# Altium footprint library 排针-排母-1.27.PcbLib: 152 footprints (part 2 of 10)
Each footprint in its own frame and in the unit in brackets; x right, y up, seen from the top. Pads: shape width x height; smd on the part's side, far side on the other; paste and mask are expansions set on the pad; w line width, h text height; cw(c..) or ccw(c..) is an arc to the next point about the centre after c.
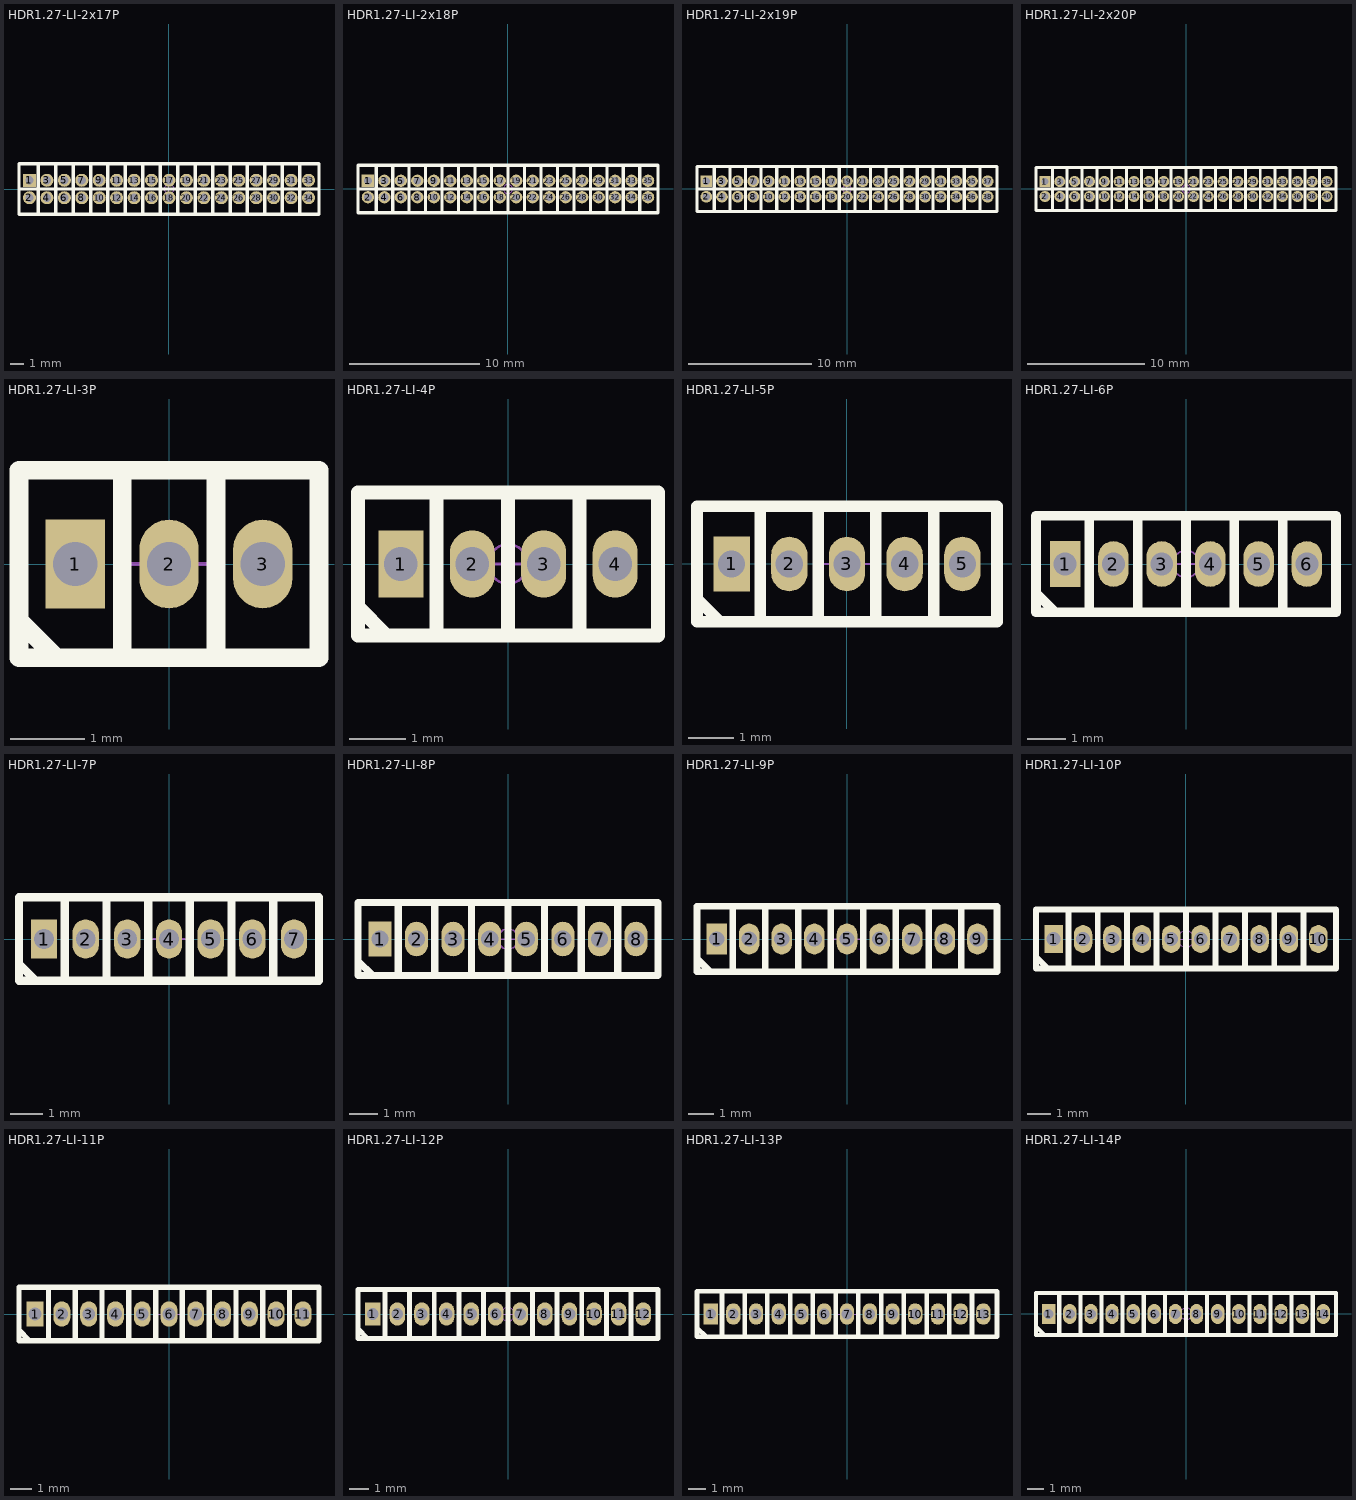
[diagram p1: the footprints below, top view; thin cyan lines are the x and y axes]

## HDR1.27-LI-2x17P [mm] "双排直插，脚距：1.27mm"
pads (34):
  rect 0.95x0.95 hole 0.6: 1(-10.16,0.635)
  round 0.95 hole 0.6: 2(-10.16,-0.635) 3(-8.89,0.635) 4(-8.89,-0.635) 5(-7.62,0.635) 6(-7.62,-0.635) 7(-6.35,0.635) 8(-6.35,-0.635) 9(-5.08,0.635) 10(-5.08,-0.635) 11(-3.81,0.635) 12(-3.81,-0.635) 13(-2.54,0.635) 14(-2.54,-0.635) 15(-1.27,0.635) 16(-1.27,-0.635) 17(0,0.635) 18(0,-0.635) 19(1.27,0.635) 20(1.27,-0.635) 21(2.54,0.635) 22(2.54,-0.635) 23(3.81,0.635) 24(3.81,-0.635) 25(5.08,0.635) 26(5.08,-0.635) 27(6.35,0.635) 28(6.35,-0.635) 29(7.62,0.635) 30(7.62,-0.635) 31(8.89,0.635) 32(8.89,-0.635) 33(10.16,0.635) 34(10.16,-0.635)
Top Overlay:
  lines w0.254: -10.922,0 10.922,0 ; -9.525,-1.829 -9.525,1.829 ; -8.255,-1.829 -8.255,1.829 ; -6.985,-1.829 -6.985,1.829 ; -5.715,-1.829 -5.715,1.829 ; -4.445,-1.829 -4.445,1.829 ; -3.175,-1.829 -3.175,1.829 ; -1.905,-1.829 -1.905,1.829 ; -0.635,-1.829 -0.635,1.829 ; 0.635,-1.829 0.635,1.829 ; 1.905,-1.829 1.905,1.829 ; 3.175,-1.829 3.175,1.829 ; 4.445,-1.829 4.445,1.829 ; 5.715,-1.829 5.715,1.829 ; 6.985,-1.829 6.985,1.829 ; 8.255,-1.829 8.255,1.829 ; 9.525,-1.829 9.525,1.829 ; -10.922,-1.829 -10.922,1.829 10.922,1.829 10.922,-1.829 -10.922,-1.829
Mechanical 15:
  circle w0.05: c0,0 r0.35
  lines w0.05: -0.5,0 0.5,0 ; 0,-0.5 0,0.5
3D body: height 3.85, standoff -2.65, extent 9.525,-1.7 10.795,1.7
3D body: height 3.85, standoff -2.65, extent 8.255,-1.7 9.525,1.7
3D body: height 3.85, standoff -2.65, extent 6.985,-1.7 8.255,1.7
3D body: height 3.85, standoff -2.65, extent 5.715,-1.7 6.985,1.7
3D body: height 3.85, standoff -2.65, extent 4.445,-1.7 5.715,1.7
3D body: height 3.85, standoff -2.65, extent 3.175,-1.7 4.445,1.7
3D body: height 3.85, standoff -2.65, extent 1.905,-1.7 3.175,1.7
3D body: height 3.85, standoff -2.65, extent 0.635,-1.7 1.905,1.7
3D body: height 3.85, standoff -2.65, extent -0.635,-1.7 0.635,1.7
3D body: height 3.85, standoff -2.65, extent -1.905,-1.7 -0.635,1.7
3D body: height 3.85, standoff -2.65, extent -3.175,-1.7 -1.905,1.7
3D body: height 3.85, standoff -2.65, extent -4.445,-1.7 -3.175,1.7
3D body: height 3.85, standoff -2.65, extent -5.715,-1.7 -4.445,1.7
3D body: height 3.85, standoff -2.65, extent -6.985,-1.7 -5.715,1.7
3D body: height 3.85, standoff -2.65, extent -10.795,-1.7 -9.525,1.7
3D body: height 3.85, standoff -2.65, extent -9.525,-1.7 -8.255,1.7
3D body: height 3.85, standoff -2.65, extent -8.255,-1.7 -6.985,1.7

## HDR1.27-LI-2x18P [mm] "双排直插，脚距：1.27mm"
pads (36):
  rect 0.95x0.95 hole 0.6: 1(-10.795,0.635)
  round 0.95 hole 0.6: 2(-10.795,-0.635) 3(-9.525,0.635) 4(-9.525,-0.635) 5(-8.255,0.635) 6(-8.255,-0.635) 7(-6.985,0.635) 8(-6.985,-0.635) 9(-5.715,0.635) 10(-5.715,-0.635) 11(-4.445,0.635) 12(-4.445,-0.635) 13(-3.175,0.635) 14(-3.175,-0.635) 15(-1.905,0.635) 16(-1.905,-0.635) 17(-0.635,0.635) 18(-0.635,-0.635) 19(0.635,0.635) 20(0.635,-0.635) 21(1.905,0.635) 22(1.905,-0.635) 23(3.175,0.635) 24(3.175,-0.635) 25(4.445,0.635) 26(4.445,-0.635) 27(5.715,0.635) 28(5.715,-0.635) 29(6.985,0.635) 30(6.985,-0.635) 31(8.255,0.635) 32(8.255,-0.635) 33(9.525,0.635) 34(9.525,-0.635) 35(10.795,0.635) 36(10.795,-0.635)
Top Overlay:
  lines w0.254: -11.557,0 11.557,0 ; -10.16,-1.829 -10.16,1.829 ; -8.89,-1.829 -8.89,1.829 ; -7.62,-1.829 -7.62,1.829 ; -6.35,-1.829 -6.35,1.829 ; -5.08,-1.829 -5.08,1.829 ; -3.81,-1.829 -3.81,1.829 ; -2.54,-1.829 -2.54,1.829 ; -1.27,-1.829 -1.27,1.829 ; 0,-1.829 0,1.829 ; 1.27,-1.829 1.27,1.829 ; 2.54,-1.829 2.54,1.829 ; 3.81,-1.829 3.81,1.829 ; 5.08,-1.829 5.08,1.829 ; 6.35,-1.829 6.35,1.829 ; 7.62,-1.829 7.62,1.829 ; 8.89,-1.829 8.89,1.829 ; 10.16,-1.829 10.16,1.829 ; -11.557,-1.829 11.557,-1.829 11.557,1.829 -11.557,1.829 -11.557,-1.829
Mechanical 15:
  circle w0.05: c0,0 r0.35
  lines w0.05: -0.5,0 0.5,0 ; 0,-0.5 0,0.5
3D body: height 3.85, standoff -2.65, extent -8.89,-1.7 -7.62,1.7
3D body: height 3.85, standoff -2.65, extent -10.16,-1.7 -8.89,1.7
3D body: height 3.85, standoff -2.65, extent -11.43,-1.7 -10.16,1.7
3D body: height 3.85, standoff -2.65, extent -7.62,-1.7 -6.35,1.7
3D body: height 3.85, standoff -2.65, extent -6.35,-1.7 -5.08,1.7
3D body: height 3.85, standoff -2.65, extent -5.08,-1.7 -3.81,1.7
3D body: height 3.85, standoff -2.65, extent -3.81,-1.7 -2.54,1.7
3D body: height 3.85, standoff -2.65, extent -2.54,-1.7 -1.27,1.7
3D body: height 3.85, standoff -2.65, extent -1.27,-1.7 0,1.7
3D body: height 3.85, standoff -2.65, extent 0,-1.7 1.27,1.7
3D body: height 3.85, standoff -2.65, extent 1.27,-1.7 2.54,1.7
3D body: height 3.85, standoff -2.65, extent 2.54,-1.7 3.81,1.7
3D body: height 3.85, standoff -2.65, extent 3.81,-1.7 5.08,1.7
3D body: height 3.85, standoff -2.65, extent 5.08,-1.7 6.35,1.7
3D body: height 3.85, standoff -2.65, extent 6.35,-1.7 7.62,1.7
3D body: height 3.85, standoff -2.65, extent 7.62,-1.7 8.89,1.7
3D body: height 3.85, standoff -2.65, extent 8.89,-1.7 10.16,1.7
3D body: height 3.85, standoff -2.65, extent 10.16,-1.7 11.43,1.7

## HDR1.27-LI-2x19P [mm] "双排直插，脚距：1.27mm"
pads (38):
  rect 0.95x0.95 hole 0.6: 1(-11.43,0.635)
  round 0.95 hole 0.6: 2(-11.43,-0.635) 3(-10.16,0.635) 4(-10.16,-0.635) 5(-8.89,0.635) 6(-8.89,-0.635) 7(-7.62,0.635) 8(-7.62,-0.635) 9(-6.35,0.635) 10(-6.35,-0.635) 11(-5.08,0.635) 12(-5.08,-0.635) 13(-3.81,0.635) 14(-3.81,-0.635) 15(-2.54,0.635) 16(-2.54,-0.635) 17(-1.27,0.635) 18(-1.27,-0.635) 19(0,0.635) 20(0,-0.635) 21(1.27,0.635) 22(1.27,-0.635) 23(2.54,0.635) 24(2.54,-0.635) 25(3.81,0.635) 26(3.81,-0.635) 27(5.08,0.635) 28(5.08,-0.635) 29(6.35,0.635) 30(6.35,-0.635) 31(7.62,0.635) 32(7.62,-0.635) 33(8.89,0.635) 34(8.89,-0.635) 35(10.16,0.635) 36(10.16,-0.635) 37(11.43,0.635) 38(11.43,-0.635)
Top Overlay:
  lines w0.254: -12.192,0 12.192,0 ; -10.795,-1.829 -10.795,1.829 ; -9.525,-1.829 -9.525,1.829 ; -8.255,-1.829 -8.255,1.829 ; -6.985,-1.829 -6.985,1.829 ; -5.715,-1.829 -5.715,1.829 ; -4.445,-1.829 -4.445,1.829 ; -3.175,-1.829 -3.175,1.829 ; -1.905,-1.829 -1.905,1.829 ; -0.635,-1.829 -0.635,1.829 ; 0.635,-1.829 0.635,1.829 ; 1.905,-1.829 1.905,1.829 ; 3.175,-1.829 3.175,1.829 ; 4.445,-1.829 4.445,1.829 ; 5.715,-1.829 5.715,1.829 ; 6.985,-1.829 6.985,1.829 ; 8.255,-1.829 8.255,1.829 ; 9.525,-1.829 9.525,1.829 ; 10.795,-1.829 10.795,1.829 ; -12.192,-1.829 -12.192,1.829 12.192,1.829 12.192,-1.829 -12.192,-1.829
Mechanical 15:
  circle w0.05: c0,0 r0.35
  lines w0.05: -0.5,0 0.5,0 ; 0,-0.5 0,0.5
3D body: height 3.85, standoff -2.65, extent 10.795,-1.7 12.065,1.7
3D body: height 3.85, standoff -2.65, extent 9.525,-1.7 10.795,1.7
3D body: height 3.85, standoff -2.65, extent 8.255,-1.7 9.525,1.7
3D body: height 3.85, standoff -2.65, extent 6.985,-1.7 8.255,1.7
3D body: height 3.85, standoff -2.65, extent 5.715,-1.7 6.985,1.7
3D body: height 3.85, standoff -2.65, extent 4.445,-1.7 5.715,1.7
3D body: height 3.85, standoff -2.65, extent 3.175,-1.7 4.445,1.7
3D body: height 3.85, standoff -2.65, extent 1.905,-1.7 3.175,1.7
3D body: height 3.85, standoff -2.65, extent 0.635,-1.7 1.905,1.7
3D body: height 3.85, standoff -2.65, extent -0.635,-1.7 0.635,1.7
3D body: height 3.85, standoff -2.65, extent -1.905,-1.7 -0.635,1.7
3D body: height 3.85, standoff -2.65, extent -3.175,-1.7 -1.905,1.7
3D body: height 3.85, standoff -2.65, extent -4.445,-1.7 -3.175,1.7
3D body: height 3.85, standoff -2.65, extent -5.715,-1.7 -4.445,1.7
3D body: height 3.85, standoff -2.65, extent -6.985,-1.7 -5.715,1.7
3D body: height 3.85, standoff -2.65, extent -8.255,-1.7 -6.985,1.7
3D body: height 3.85, standoff -2.65, extent -12.065,-1.7 -10.795,1.7
3D body: height 3.85, standoff -2.65, extent -10.795,-1.7 -9.525,1.7
3D body: height 3.85, standoff -2.65, extent -9.525,-1.7 -8.255,1.7

## HDR1.27-LI-2x20P [mm] "双排直插，脚距：1.27mm"
pads (40):
  rect 0.95x0.95 hole 0.6: 1(-12.065,0.635)
  round 0.95 hole 0.6: 2(-12.065,-0.635) 3(-10.795,0.635) 4(-10.795,-0.635) 5(-9.525,0.635) 6(-9.525,-0.635) 7(-8.255,0.635) 8(-8.255,-0.635) 9(-6.985,0.635) 10(-6.985,-0.635) 11(-5.715,0.635) 12(-5.715,-0.635) 13(-4.445,0.635) 14(-4.445,-0.635) 15(-3.175,0.635) 16(-3.175,-0.635) 17(-1.905,0.635) 18(-1.905,-0.635) 19(-0.635,0.635) 20(-0.635,-0.635) 21(0.635,0.635) 22(0.635,-0.635) 23(1.905,0.635) 24(1.905,-0.635) 25(3.175,0.635) 26(3.175,-0.635) 27(4.445,0.635) 28(4.445,-0.635) 29(5.715,0.635) 30(5.715,-0.635) 31(6.985,0.635) 32(6.985,-0.635) 33(8.255,0.635) 34(8.255,-0.635) 35(9.525,0.635) 36(9.525,-0.635) 37(10.795,0.635) 38(10.795,-0.635) 39(12.065,0.635) 40(12.065,-0.635)
Top Overlay:
  lines w0.254: -12.827,0 12.827,0 ; -11.43,-1.829 -11.43,1.829 ; -10.16,-1.829 -10.16,1.829 ; -8.89,-1.829 -8.89,1.829 ; -7.62,-1.829 -7.62,1.829 ; -6.35,-1.829 -6.35,1.829 ; -5.08,-1.829 -5.08,1.829 ; -3.81,-1.829 -3.81,1.829 ; -2.54,-1.829 -2.54,1.829 ; -1.27,-1.829 -1.27,1.829 ; 0,-1.829 0,1.829 ; 1.27,-1.829 1.27,1.829 ; 2.54,-1.829 2.54,1.829 ; 3.81,-1.829 3.81,1.829 ; 5.08,-1.829 5.08,1.829 ; 6.35,-1.829 6.35,1.829 ; 7.62,-1.829 7.62,1.829 ; 8.89,-1.829 8.89,1.829 ; 10.16,-1.829 10.16,1.829 ; 11.43,-1.829 11.43,1.829 ; -12.827,-1.829 12.827,-1.829 12.827,1.829 -12.827,1.829 -12.827,-1.829
Mechanical 15:
  circle w0.05: c0,0 r0.35
  lines w0.05: -0.5,0 0.5,0 ; 0,-0.5 0,0.5
3D body: height 3.85, standoff -2.65, extent -10.16,-1.7 -8.89,1.7
3D body: height 3.85, standoff -2.65, extent -11.43,-1.7 -10.16,1.7
3D body: height 3.85, standoff -2.65, extent -12.7,-1.7 -11.43,1.7
3D body: height 3.85, standoff -2.65, extent -8.89,-1.7 -7.62,1.7
3D body: height 3.85, standoff -2.65, extent -7.62,-1.7 -6.35,1.7
3D body: height 3.85, standoff -2.65, extent -6.35,-1.7 -5.08,1.7
3D body: height 3.85, standoff -2.65, extent -5.08,-1.7 -3.81,1.7
3D body: height 3.85, standoff -2.65, extent -3.81,-1.7 -2.54,1.7
3D body: height 3.85, standoff -2.65, extent -2.54,-1.7 -1.27,1.7
3D body: height 3.85, standoff -2.65, extent -1.27,-1.7 0,1.7
3D body: height 3.85, standoff -2.65, extent 0,-1.7 1.27,1.7
3D body: height 3.85, standoff -2.65, extent 1.27,-1.7 2.54,1.7
3D body: height 3.85, standoff -2.65, extent 2.54,-1.7 3.81,1.7
3D body: height 3.85, standoff -2.65, extent 3.81,-1.7 5.08,1.7
3D body: height 3.85, standoff -2.65, extent 5.08,-1.7 6.35,1.7
3D body: height 3.85, standoff -2.65, extent 6.35,-1.7 7.62,1.7
3D body: height 3.85, standoff -2.65, extent 7.62,-1.7 8.89,1.7
3D body: height 3.85, standoff -2.65, extent 8.89,-1.7 10.16,1.7
3D body: height 3.85, standoff -2.65, extent 10.16,-1.7 11.43,1.7
3D body: height 3.85, standoff -2.65, extent 11.43,-1.7 12.7,1.7

## HDR1.27-LI-3P [mm] "直插，脚距：1.27mm"
pads (3):
  rect 0.8x1.2 hole 0.6: 1(-1.27,0)
  oval 0.8x1.2 hole 0.6: 2(0,0) 3(1.27,0)
Top Overlay:
  lines w0.254: -2.032,-0.762 -1.524,-1.27 ; -0.635,-1.27 -0.635,1.27 ; 0.635,-1.27 0.635,1.2 ; -2.032,-1.27 2.032,-1.27 2.032,1.27 -2.032,1.27 -2.032,-1.27
Mechanical 15:
  circle w0.05: c0,0 r0.35
  lines w0.05: -0.5,0 0.5,0 ; 0,-0.5 0,0.5
3D body: height 4.48, standoff -2.72, extent -1.905,-1.2 1.905,1.2

## HDR1.27-LI-4P [mm] "直插，脚距：1.27mm"
pads (4):
  rect 0.8x1.2 hole 0.6: 1(-1.905,0)
  oval 0.8x1.2 hole 0.6: 2(-0.635,0) 3(0.635,0) 4(1.905,0)
Top Overlay:
  lines w0.254: -2.667,-0.762 -2.159,-1.27 ; -1.27,-1.27 -1.27,1.27 ; 0,-1.27 0,1.2 ; 1.27,-1.2 1.27,1.27 ; -2.667,-1.27 -2.667,1.27 2.667,1.27 2.667,-1.27 -2.667,-1.27
Mechanical 15:
  circle w0.05: c0,0 r0.35
  lines w0.05: -0.5,0 0.5,0 ; 0,-0.5 0,0.5
3D body: height 4.48, standoff -2.72, extent -2.54,-1.235 2.54,1.165

## HDR1.27-LI-5P [mm] "直插，脚距：1.27mm"
pads (5):
  rect 0.8x1.2 hole 0.6: 1(-2.54,0)
  oval 0.8x1.2 hole 0.6: 2(-1.27,0) 3(0,0) 4(1.27,0) 5(2.54,0)
Top Overlay:
  lines w0.254: -3.302,-0.762 -2.794,-1.27 ; -1.905,-1.27 -1.905,1.27 ; -0.635,-1.27 -0.635,1.2 ; 0.635,-1.2 0.635,1.27 ; 1.905,1.27 1.905,-1.235 ; 1.905,-1.235 1.905,-1.235 ; -3.302,-1.27 -3.302,1.27 3.302,1.27 3.302,-1.27 -3.302,-1.27
Mechanical 15:
  circle w0.05: c0,0 r0.35
  lines w0.05: -0.5,0 0.5,0 ; 0,-0.5 0,0.5
3D body: height 4.48, standoff -2.72, extent -3.175,-1.2 3.175,1.2

## HDR1.27-LI-6P [mm] "直插，脚距：1.27mm"
pads (6):
  rect 0.8x1.2 hole 0.6: 1(-3.175,0)
  oval 0.8x1.2 hole 0.6: 2(-1.905,0) 3(-0.635,0) 4(0.635,0) 5(1.905,0) 6(3.175,0)
Top Overlay:
  lines w0.254: -3.937,-0.762 -3.429,-1.27 ; -2.54,-1.27 -2.54,1.27 ; -1.27,-1.27 -1.27,1.2 ; 0,-1.2 0,1.27 ; 1.27,1.27 1.27,-1.235 ; 2.54,-1.235 2.54,1.27 ; 1.27,-1.235 1.27,-1.235 ; -3.937,-1.27 3.937,-1.27 3.937,1.27 -3.937,1.27 -3.937,-1.27
Mechanical 15:
  circle w0.05: c0,0 r0.35
  lines w0.05: -0.5,0 0.5,0 ; 0,-0.5 0,0.5
3D body: height 4.48, standoff -2.72, extent -3.81,-1.2 3.81,1.2

## HDR1.27-LI-7P [mm] "直插，脚距：1.27mm"
pads (7):
  rect 0.8x1.2 hole 0.6: 1(-3.81,0)
  oval 0.8x1.2 hole 0.6: 2(-2.54,0) 3(-1.27,0) 4(0,0) 5(1.27,0) 6(2.54,0) 7(3.81,0)
Top Overlay:
  lines w0.254: -4.572,-0.762 -4.064,-1.27 ; -3.175,-1.27 -3.175,1.27 ; -1.905,-1.27 -1.905,1.2 ; -0.635,-1.2 -0.635,1.27 ; 0.635,1.27 0.635,-1.235 ; 1.905,-1.235 1.905,1.27 ; 3.175,-1.27 3.175,1.235 ; 0.635,-1.235 0.635,-1.235 ; -4.572,-1.27 4.572,-1.27 4.572,1.27 -4.572,1.27 -4.572,-1.27
Mechanical 15:
  circle w0.05: c0,0 r0.35
  lines w0.05: -0.5,0 0.5,0 ; 0,-0.5 0,0.5
3D body: height 4.48, standoff -2.72, extent -4.445,-1.2 4.445,1.2

## HDR1.27-LI-8P [mm] "直插，脚距：1.27mm"
pads (8):
  rect 0.8x1.2 hole 0.6: 1(-4.445,0)
  oval 0.8x1.2 hole 0.6: 2(-3.175,0) 3(-1.905,0) 4(-0.635,0) 5(0.635,0) 6(1.905,0) 7(3.175,0) 8(4.445,0)
Top Overlay:
  lines w0.254: -5.207,-0.762 -4.699,-1.27 ; -3.81,-1.27 -3.81,1.27 ; -2.54,-1.27 -2.54,1.2 ; -1.27,-1.2 -1.27,1.27 ; 0,1.27 0,-1.235 ; 1.27,-1.235 1.27,1.27 ; 2.54,-1.27 2.54,1.235 ; 3.81,-1.235 3.81,1.27 ; 0,-1.235 0,-1.235 ; -5.207,-1.27 -5.207,1.27 5.207,1.27 5.207,-1.27 -5.207,-1.27
Mechanical 15:
  circle w0.05: c0,0 r0.35
  lines w0.05: -0.5,0 0.5,0 ; 0,-0.5 0,0.5
3D body: height 4.48, standoff -2.72, extent -5.08,-1.182 5.08,1.218

## HDR1.27-LI-9P [mm] "直插，脚距：1.27mm"
pads (9):
  rect 0.8x1.2 hole 0.6: 1(-5.08,0)
  oval 0.8x1.2 hole 0.6: 2(-3.81,0) 3(-2.54,0) 4(-1.27,0) 5(0,0) 6(1.27,0) 7(2.54,0) 8(3.81,0) 9(5.08,0)
Top Overlay:
  lines w0.254: -5.842,-0.762 -5.334,-1.27 ; -4.445,-1.27 -4.445,1.27 ; -3.175,-1.27 -3.175,1.2 ; -1.905,-1.2 -1.905,1.27 ; -0.635,1.27 -0.635,-1.235 ; 0.635,-1.235 0.635,1.27 ; 1.905,-1.27 1.905,1.235 ; 3.175,-1.235 3.175,1.27 ; 4.445,-1.27 4.445,1.235 ; -0.635,-1.235 -0.635,-1.235 ; -5.842,-1.27 5.842,-1.27 5.842,1.27 -5.842,1.27 -5.842,-1.27
Mechanical 15:
  circle w0.05: c0,0 r0.35
  lines w0.05: -0.5,0 0.5,0 ; 0,-0.5 0,0.5
3D body: height 4.48, standoff -2.72, extent -5.715,-1.2 5.715,1.2

## HDR1.27-LI-10P [mm] "直插，脚距：1.27mm"
pads (10):
  rect 0.8x1.2 hole 0.6: 1(-5.715,0)
  oval 0.8x1.2 hole 0.6: 2(-4.445,0) 3(-3.175,0) 4(-1.905,0) 5(-0.635,0) 6(0.635,0) 7(1.905,0) 8(3.175,0) 9(4.445,0) 10(5.715,0)
Top Overlay:
  lines w0.254: -6.477,-0.762 -5.969,-1.27 ; -5.08,-1.27 -5.08,1.27 ; -3.81,-1.27 -3.81,1.2 ; -2.54,-1.2 -2.54,1.27 ; -1.27,1.27 -1.27,-1.235 ; 0,-1.235 0,1.27 ; 1.27,-1.27 1.27,1.235 ; 2.54,-1.235 2.54,1.27 ; 3.81,-1.27 3.81,1.235 ; 5.08,-1.235 5.08,1.27 ; -1.27,-1.235 -1.27,-1.235 ; -6.477,-1.27 -6.477,1.27 6.477,1.27 6.477,-1.27 -6.477,-1.27
Mechanical 15:
  circle w0.05: c0,0 r0.35
  lines w0.05: -0.5,0 0.5,0 ; 0,-0.5 0,0.5
3D body: height 4.48, standoff -2.72, extent -6.35,-1.2 6.35,1.2

## HDR1.27-LI-11P [mm] "直插，脚距：1.27mm"
pads (11):
  rect 0.8x1.2 hole 0.6: 1(-6.35,0)
  oval 0.8x1.2 hole 0.6: 2(-5.08,0) 3(-3.81,0) 4(-2.54,0) 5(-1.27,0) 6(0,0) 7(1.27,0) 8(2.54,0) 9(3.81,0) 10(5.08,0) 11(6.35,0)
Top Overlay:
  lines w0.254: -7.112,-0.762 -6.604,-1.27 ; -5.715,-1.27 -5.715,1.27 ; -4.445,-1.27 -4.445,1.2 ; -3.175,-1.2 -3.175,1.27 ; -1.905,1.27 -1.905,-1.235 ; -0.635,-1.235 -0.635,1.27 ; 0.635,-1.27 0.635,1.235 ; 1.905,-1.235 1.905,1.27 ; 3.175,-1.27 3.175,1.235 ; 4.445,-1.235 4.445,1.27 ; 5.715,-1.27 5.715,1.235 ; -1.905,-1.235 -1.905,-1.235 ; -7.112,-1.27 -7.112,1.27 7.112,1.27 7.112,-1.27 -7.112,-1.27
Mechanical 15:
  circle w0.05: c0,0 r0.35
  lines w0.05: -0.5,0 0.5,0 ; 0,-0.5 0,0.5
3D body: height 4.48, standoff -2.72, extent -6.985,-1.2 6.985,1.2

## HDR1.27-LI-12P [mm] "直插，脚距：1.27mm"
pads (12):
  rect 0.8x1.2 hole 0.6: 1(-6.985,0.017)
  oval 0.8x1.2 hole 0.6: 2(-5.715,0.017) 3(-4.445,0.017) 4(-3.175,0.017) 5(-1.905,0.017) 6(-0.635,0.017) 7(0.635,0.017) 8(1.905,0.017) 9(3.175,0.017) 10(4.445,0.017) 11(5.715,0.017) 12(6.985,0.017)
Top Overlay:
  lines w0.254: -7.747,-0.745 -7.239,-1.253 ; -6.35,-1.253 -6.35,1.287 ; -5.08,-1.253 -5.08,1.217 ; -3.81,-1.182 -3.81,1.287 ; -2.54,1.287 -2.54,-1.218 ; -1.27,-1.218 -1.27,1.287 ; 0,-1.253 0,1.253 ; 1.27,-1.218 1.27,1.287 ; 2.54,-1.253 2.54,1.253 ; 3.81,-1.218 3.81,1.287 ; 5.08,-1.253 5.08,1.253 ; 6.35,-1.218 6.35,1.287 ; -2.54,-1.218 -2.54,-1.218 ; -7.747,-1.253 7.747,-1.253 7.747,1.287 -7.747,1.287 -7.747,-1.253
Mechanical 15:
  circle w0.05: c0,0 r0.35
  lines w0.05: -0.5,0 0.5,0 ; 0,-0.5 0,0.5
3D body: height 4.48, standoff -2.72, extent -7.62,-1.2 7.62,1.2

## HDR1.27-LI-13P [mm] "直插，脚距：1.27mm"
pads (13):
  rect 0.8x1.2 hole 0.6: 1(-7.62,0)
  oval 0.8x1.2 hole 0.6: 2(-6.35,0) 3(-5.08,0) 4(-3.81,0) 5(-2.54,0) 6(-1.27,0) 7(0,0) 8(1.27,0) 9(2.54,0) 10(3.81,0) 11(5.08,0) 12(6.35,0) 13(7.62,0)
Top Overlay:
  lines w0.254: -8.382,-0.762 -7.874,-1.27 ; -6.985,-1.27 -6.985,1.27 ; -5.715,-1.27 -5.715,1.2 ; -4.445,-1.2 -4.445,1.27 ; -3.175,1.27 -3.175,-1.235 ; -1.905,-1.235 -1.905,1.27 ; -0.635,-1.27 -0.635,1.235 ; 0.635,-1.235 0.635,1.27 ; 1.905,-1.27 1.905,1.235 ; 3.175,-1.235 3.175,1.27 ; 4.445,-1.27 4.445,1.235 ; 5.715,-1.235 5.715,1.27 ; 6.985,-1.27 6.985,1.235 ; -3.175,-1.235 -3.175,-1.235 ; -8.382,-1.27 8.382,-1.27 8.382,1.27 -8.382,1.27 -8.382,-1.27
Mechanical 15:
  circle w0.05: c0,0 r0.35
  lines w0.05: -0.5,0 0.5,0 ; 0,-0.5 0,0.5
3D body: height 4.48, standoff -2.72, extent -8.255,-1.2 8.255,1.2

## HDR1.27-LI-14P [mm] "直插，脚距：1.27mm"
pads (14):
  rect 0.8x1.2 hole 0.6: 1(-8.255,-0.017)
  oval 0.8x1.2 hole 0.6: 2(-6.985,-0.017) 3(-5.715,-0.017) 4(-4.445,-0.017) 5(-3.175,-0.017) 6(-1.905,-0.017) 7(-0.635,-0.017) 8(0.635,-0.017) 9(1.905,-0.017) 10(3.175,-0.017) 11(4.445,-0.017) 12(5.715,-0.017) 13(6.985,-0.017) 14(8.255,-0.017)
Top Overlay:
  lines w0.254: -9.017,-0.779 -8.509,-1.287 ; -7.62,-1.287 -7.62,1.253 ; -6.35,-1.287 -6.35,1.183 ; -5.08,-1.217 -5.08,1.253 ; -3.81,1.253 -3.81,-1.253 ; -2.54,-1.253 -2.54,1.253 ; -1.27,-1.287 -1.27,1.218 ; 0,-1.253 0,1.253 ; 1.27,-1.287 1.27,1.218 ; 2.54,-1.253 2.54,1.253 ; 3.81,-1.287 3.81,1.218 ; 5.08,-1.253 5.08,1.253 ; 6.35,-1.287 6.35,1.218 ; 7.62,-1.253 7.62,1.253 ; -3.81,-1.253 -3.81,-1.253 ; -9.017,-1.287 -9.017,1.253 9.017,1.253 9.017,-1.287 -9.017,-1.287
Mechanical 15:
  circle w0.05: c0,0 r0.35
  lines w0.05: -0.5,0 0.5,0 ; 0,-0.5 0,0.5
3D body: height 4.48, standoff -2.72, extent -8.89,-1.2 8.89,1.2